# Altium footprint library devices.PCBLIB: 335 footprints (part 16 of 21)
Each footprint in its own frame and in the unit in brackets; x right, y up, seen from the top. Pads: shape width x height; smd on the part's side, far side on the other; paste and mask are expansions set on the pad; w line width, h text height; cw(c..) or ccw(c..) is an arc to the next point about the centre after c.
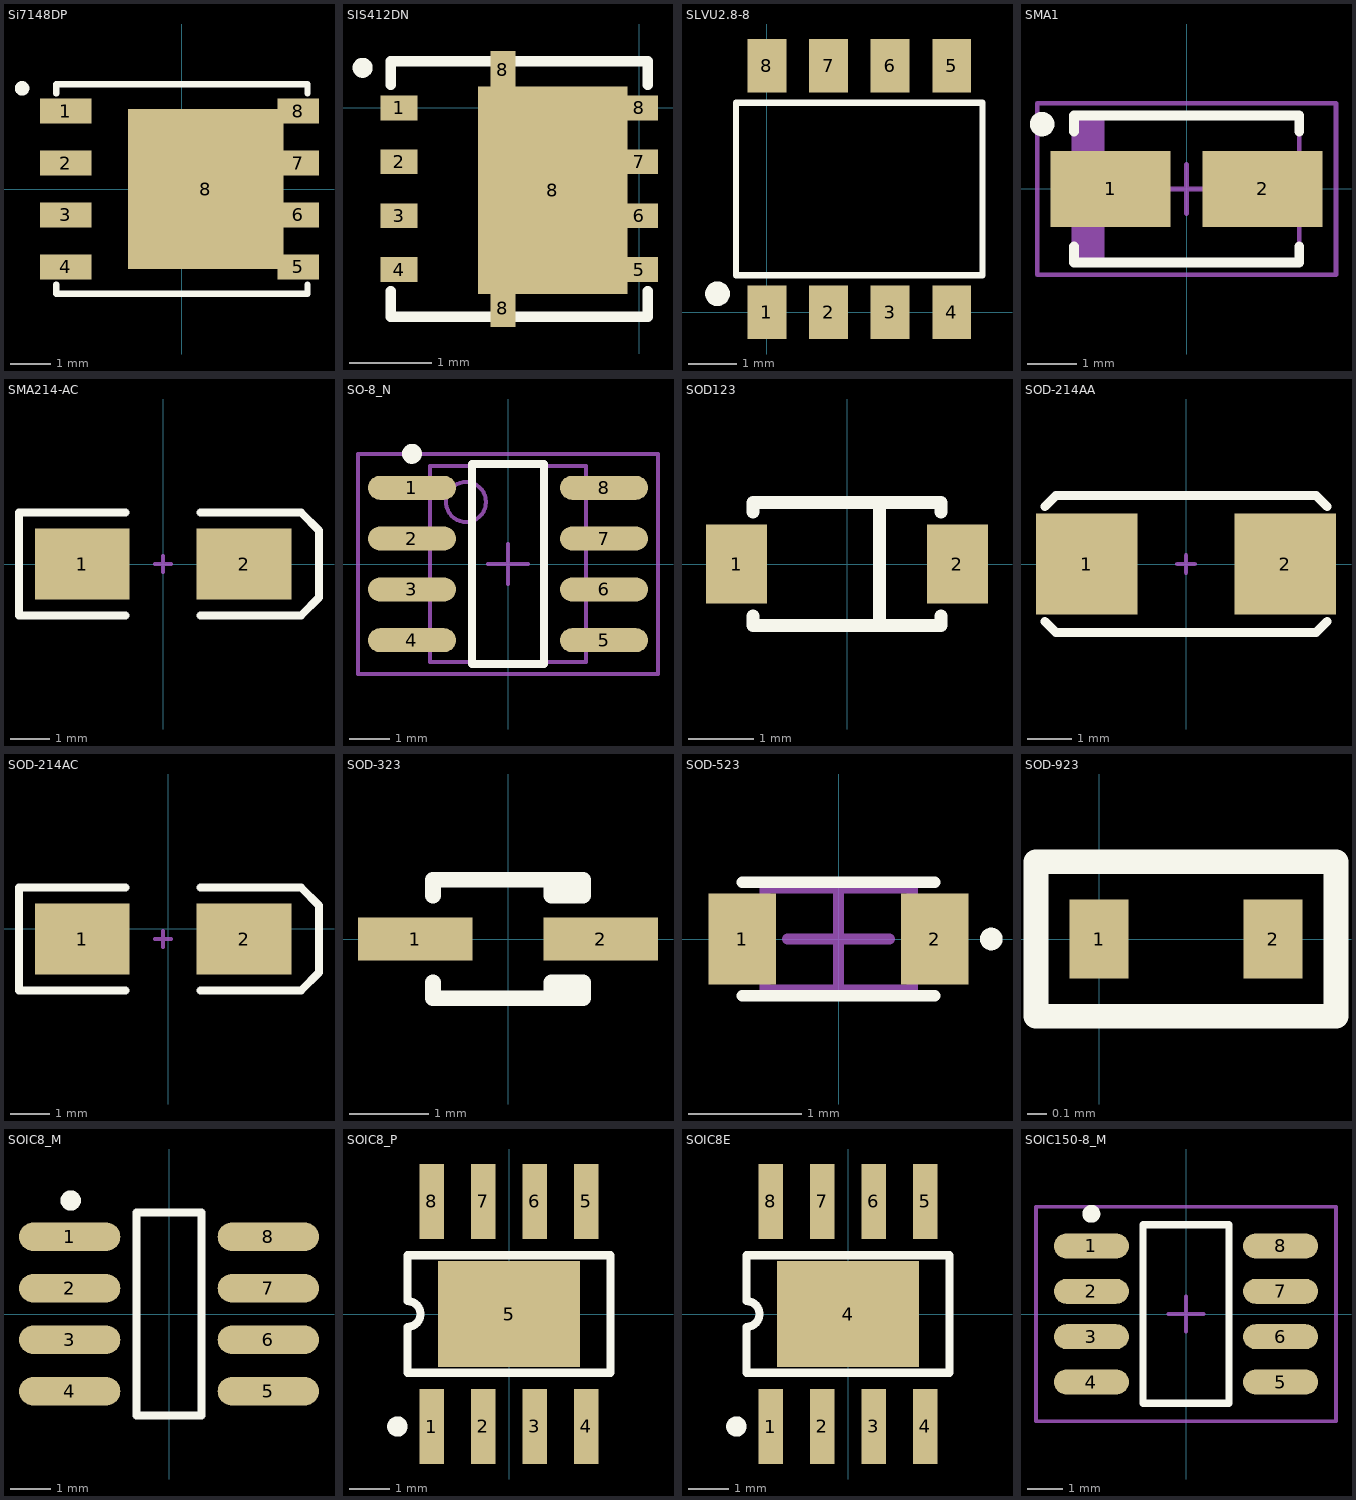
[diagram p15: the footprints below, top view; thin cyan lines are the x and y axes]

## Si7148DP [mm]
pads (9):
  rect 1.27x0.61 smd: 1(-2.845,1.905) 2(-2.845,0.635) 3(-2.845,-0.635) 4(-2.845,-1.905)
  rect 1.02x0.61 smd: 5(2.845,-1.905) 6(2.845,-0.635) 7(2.845,0.635) 8(2.845,1.905)
  rect 3.81x3.91 smd: 8(0.584,0)
Top Overlay:
  circle w0.203: c-3.912,2.464 r0.076
  lines w0.152: -3.073,-2.337 -3.073,-2.565 0,-2.565 3.073,-2.565 3.073,-2.337 ; -3.073,2.337 -3.073,2.565 0,2.565 3.073,2.565 3.073,2.337

## SIS412DN [mm]
pads (11):
  rect 0.45x0.3 smd: 1(-2.896,0) 2(-2.896,-0.65) 3(-2.896,-1.3) 4(-2.896,-1.95) 5(0,-1.95) 6(0,-1.3) 7(0,-0.65) 8(0,0)
  rect 0.3x0.45 smd: 8(-1.645,-2.413) 8(-1.645,0.457)
  rect 1.8x2.5 smd: 8(-1.041,-0.991)
Top Overlay:
  circle w0.127: c-3.333,0.483 r0.057
  lines w0.127: -2.997,-2.21 -2.997,-2.515 0.102,-2.515 0.102,-2.21 ; -2.997,0.279 -2.997,0.559 0.102,0.559 0.102,0.279

## SLVU2.8-8 [mm]
pads (8):
  rect 0.8x1.1 smd: 1(0,0) 2(1.27,0) 3(2.54,0) 4(3.81,0) 5(3.81,5.08) 6(2.54,5.08) 7(1.27,5.08) 8(0,5.08)
Top Overlay:
  circle w0.254: c-1.016,0.381 r0.127
  lines w0.127: -0.635,0.762 4.445,0.762 4.445,4.318 -0.635,4.318 -0.635,0.762

## SMA1 [mm] "Molded Capacitor, 2-Leads, Body 4.3x2.6mm, IPC Medium Density"
height 2.62
pads (2):
  rect 2.45x1.55 smd: 1(-1.55,0) 2(1.55,0)
Top Overlay:
  circle w0.25: c-2.95,1.325 r0.125
  lines w0.2: -2.3,-1.175 -2.3,-1.5 2.3,-1.5 2.3,-1.175 ; -2.3,1.175 -2.3,1.5 2.3,1.5 2.3,1.175
Mechanical 13:
  rectangle: -2.3,-1.46 -1.681,1.46
  lines w0.1: -2.3,-1.46 2.3,-1.46 2.3,1.46 -2.3,1.46 -2.3,-1.46
Mechanical 15:
  lines w0.1: -0.5,0 0.5,0 ; 0,-0.5 0,0.5 ; -3.05,-1.75 3.05,-1.75 3.05,1.75 -3.05,1.75 -3.05,-1.75
3D body: height 2.62, standoff 0, extent -2.3,-1.46 2.3,1.46

## SMA214-AC [mm] "DO-214-AC/SMA; 2 C-Bend Leads; Body 5 x 2.7 mm, inc. leads (LxW)"
height 2.44
pads (2):
  rect 2.4x1.8 smd: 1(-2.05,0) 2(2.05,0)
Top Overlay:
  lines w0.2: -0.95,-1.3 -3.65,-1.3 -3.65,1.3 -0.95,1.3 ; 0.95,-1.3 3.5,-1.3 3.95,-0.85 3.95,0.85 3.5,1.3 0.95,1.3
Mechanical 1:
  lines w0.1: -0.2,0 0.2,0 ; 0,-0.2 0,0.2

## SO-8_N [mm] "SOIC, 8-Leads, Body 4.9x3.9mm, Pitch 1.27mm, IPC Medium Density"
height 1.75
pads (8):
  oval 2.2x0.6 smd: 1(-2.4,1.905) 2(-2.4,0.635) 3(-2.4,-0.635) 4(-2.4,-1.905) 5(2.4,-1.905) 6(2.4,-0.635) 7(2.4,0.635) 8(2.4,1.905)
Top Overlay:
  circle w0.25: c-2.4,2.755 r0.125
  lines w0.2: -0.9,-2.5 0.9,-2.5 0.9,2.5 -0.9,2.5 -0.9,-2.5
Mechanical 13:
  circle w0.1: c-1.05,1.55 r0.5
  lines w0.1: -1.95,-2.45 1.95,-2.45 1.95,2.45 -1.95,2.45 -1.95,-2.45
Mechanical 15:
  lines w0.1: -0.5,0 0.5,0 ; 0,-0.5 0,0.5 ; -3.75,-2.75 3.75,-2.75 3.75,2.75 -3.75,2.75 -3.75,-2.75
3D body: height 1.75, standoff 0, extent -1.95,-2.45 1.95,2.45

## SOD123 [mil] "SOD-123; 2 Leads; Body 2.7 x 1.6 mm, (LxW)"
height 53.15
pads (2):
  rect 37x48 smd: 1(-66.93,0) 2(66.93,0)
Top Overlay:
  lines w7.87: -57.09,-31.5 -57.09,-37.4 57.09,-37.4 57.09,-31.5 ; -57.09,31.5 -57.09,37.4 57.09,37.4 57.09,31.5 ; 19.68,-33.46 19.68,33.46

## SOD-214AA [mm] "DO-214-AA/SMB; 2 C-Bend Leads; Body 5.3 x 3.6 mm, inc. leads (LxW)"
height 2.54
pads (2):
  rect 2.3x2.3 smd: 1(-2.25,0) 2(2.25,0)
Top Overlay:
  lines w0.2: -3.2,-1.3 -2.95,-1.55 -2.9,-1.55 2.9,-1.55 2.95,-1.55 3.2,-1.3 ; -3.2,1.3 -2.95,1.55 -2.9,1.55 2.9,1.55 2.95,1.55 3.2,1.3
Mechanical 1:
  lines w0.1: -0.2,0 0.2,0 ; 0,-0.2 0,0.2

## SOD-214AC [mm]
pads (2):
  rect 2.4x1.8 smd: 1(-2.177,-0.254) 2(1.923,-0.254)
Top Overlay:
  lines w0.2: -1.077,-1.554 -3.777,-1.554 -3.777,1.046 -1.077,1.046 ; 0.823,-1.554 3.373,-1.554 3.823,-1.104 3.823,0.596 3.373,1.046 0.823,1.046
Mechanical 1:
  lines w0.1: -0.327,-0.254 0.073,-0.254 ; -0.127,-0.454 -0.127,-0.054

## SOD-323 [mm] "SOD-323/SC-76; 2 Leads; Body 1.7 x 1.3 mm, (LxW)"
height 1.1
pads (2):
  rect 1.45x0.55 smd: 1(-1.175,0) 2(1.175,0)
Top Overlay:
  lines w0.2: -0.95,-0.55 -0.95,-0.75 0.95,-0.75 0.95,-0.55 0.55,-0.55 0.55,-0.75 ; -0.95,0.55 -0.95,0.75 0.95,0.75 0.95,0.55 0.55,0.55 0.55,0.75

## SOD-523 [mm]
pads (2):
  rect 0.6x0.8 smd: 1(-0.85,0) 2(0.85,0)
Top Overlay:
  circle w0.1: c1.35,0 r0.05
  lines w0.1: -0.85,-0.5 0.85,-0.5 ; -0.85,0.5 0.85,0.5
Mechanical 13:
  lines w0.1: -0.65,-0.45 0.65,-0.45 0.65,0.45 -0.65,0.45 -0.65,-0.45
Mechanical 15:
  lines w0.1: -0.45,0 0.45,0 ; 0,-0.45 0,0.45
3D body: height 0.7, standoff 0, extent -0.649,-0.449 0.649,0.449

## SOD-923 [mil]
pads (2):
  rect 12x16 smd: 1(0,0) 2(35.44,0)
Top Overlay:
  lines w5: -12.83,-15.75 48.23,-15.75 48.23,15.75 -12.83,15.75 -12.83,-15.75

## SOIC8_M [mm] "SOIC, 8-Leads, Body 4.9x3.9mm, Pitch 1.27mm, IPC Low Density"
height 1.75
pads (8):
  oval 2.5x0.7 smd: 1(-2.45,1.905) 2(-2.45,0.635) 3(-2.45,-0.635) 4(-2.45,-1.905) 5(2.45,-1.905) 6(2.45,-0.635) 7(2.45,0.635) 8(2.45,1.905)
Top Overlay:
  circle w0.25: c-2.425,2.8 r0.125
  lines w0.2: -0.8,-2.5 0.8,-2.5 0.8,2.5 -0.8,2.5 -0.8,-2.5

## SOIC8_P [mm]
pads (9):
  rect 0.6x1.85 smd: 1(-1.905,-2.775) 2(-0.635,-2.775) 3(0.635,-2.775) 4(1.905,-2.775) 5(1.905,2.775) 6(0.635,2.775) 7(-0.635,2.775) 8(-1.905,2.775)
  rect 3.51x2.62 smd: 5(0,0)
Top Overlay:
  circle w0.25: c-2.755,-2.775 r0.125
  lines w0.2: -2.5,-1.45 2.5,-1.45 2.5,1.45 -2.5,1.45 -2.5,0.318 cw(c-2.5,0) -2.5,-0.318 -2.5,-1.45

## SOIC8E [mm]
pads (9):
  rect 0.6x1.85 smd: 1(-1.905,-2.775) 2(-0.635,-2.775) 3(0.635,-2.775) 4(1.905,-2.775) 5(1.905,2.775) 6(0.635,2.775) 7(-0.635,2.775) 8(-1.905,2.775)
  rect 3.51x2.62 smd: 4(0,0)
Top Overlay:
  circle w0.25: c-2.755,-2.775 r0.125
  lines w0.2: -2.5,-1.45 2.5,-1.45 2.5,1.45 -2.5,1.45 -2.5,0.318 cw(c-2.5,0) -2.5,-0.318 -2.5,-1.45

## SOIC150-8_M [mm] "SOIC, 8-Leads, Body 4.9x3.8mm, Pitch 1.27mm, IPC Low Density"
height 1.76
pads (8):
  oval 2.1x0.7 smd: 1(-2.65,1.905) 2(-2.65,0.635) 3(-2.65,-0.635) 4(-2.65,-1.905) 5(2.65,-1.905) 6(2.65,-0.635) 7(2.65,0.635) 8(2.65,1.905)
Top Overlay:
  circle w0.25: c-2.65,2.805 r0.125
  lines w0.2: -1.2,-2.5 -1.2,2.5 1.2,2.5 1.2,-2.5 -1.2,-2.5
Mechanical 15:
  lines w0.1: -0.5,0 0.5,0 ; 0,-0.5 0,0.5 ; -4.2,-3 -4.2,3 4.2,3 4.2,-3 -4.2,-3